# Altium footprint library myPcbLib.PcbLib: 987 footprints (part 57 of 62)
Each footprint in its own frame and in the unit in brackets; x right, y up, seen from the top. Pads: shape width x height; smd on the part's side, far side on the other; paste and mask are expansions set on the pad; w line width, h text height; cw(c..) or ccw(c..) is an arc to the next point about the centre after c.
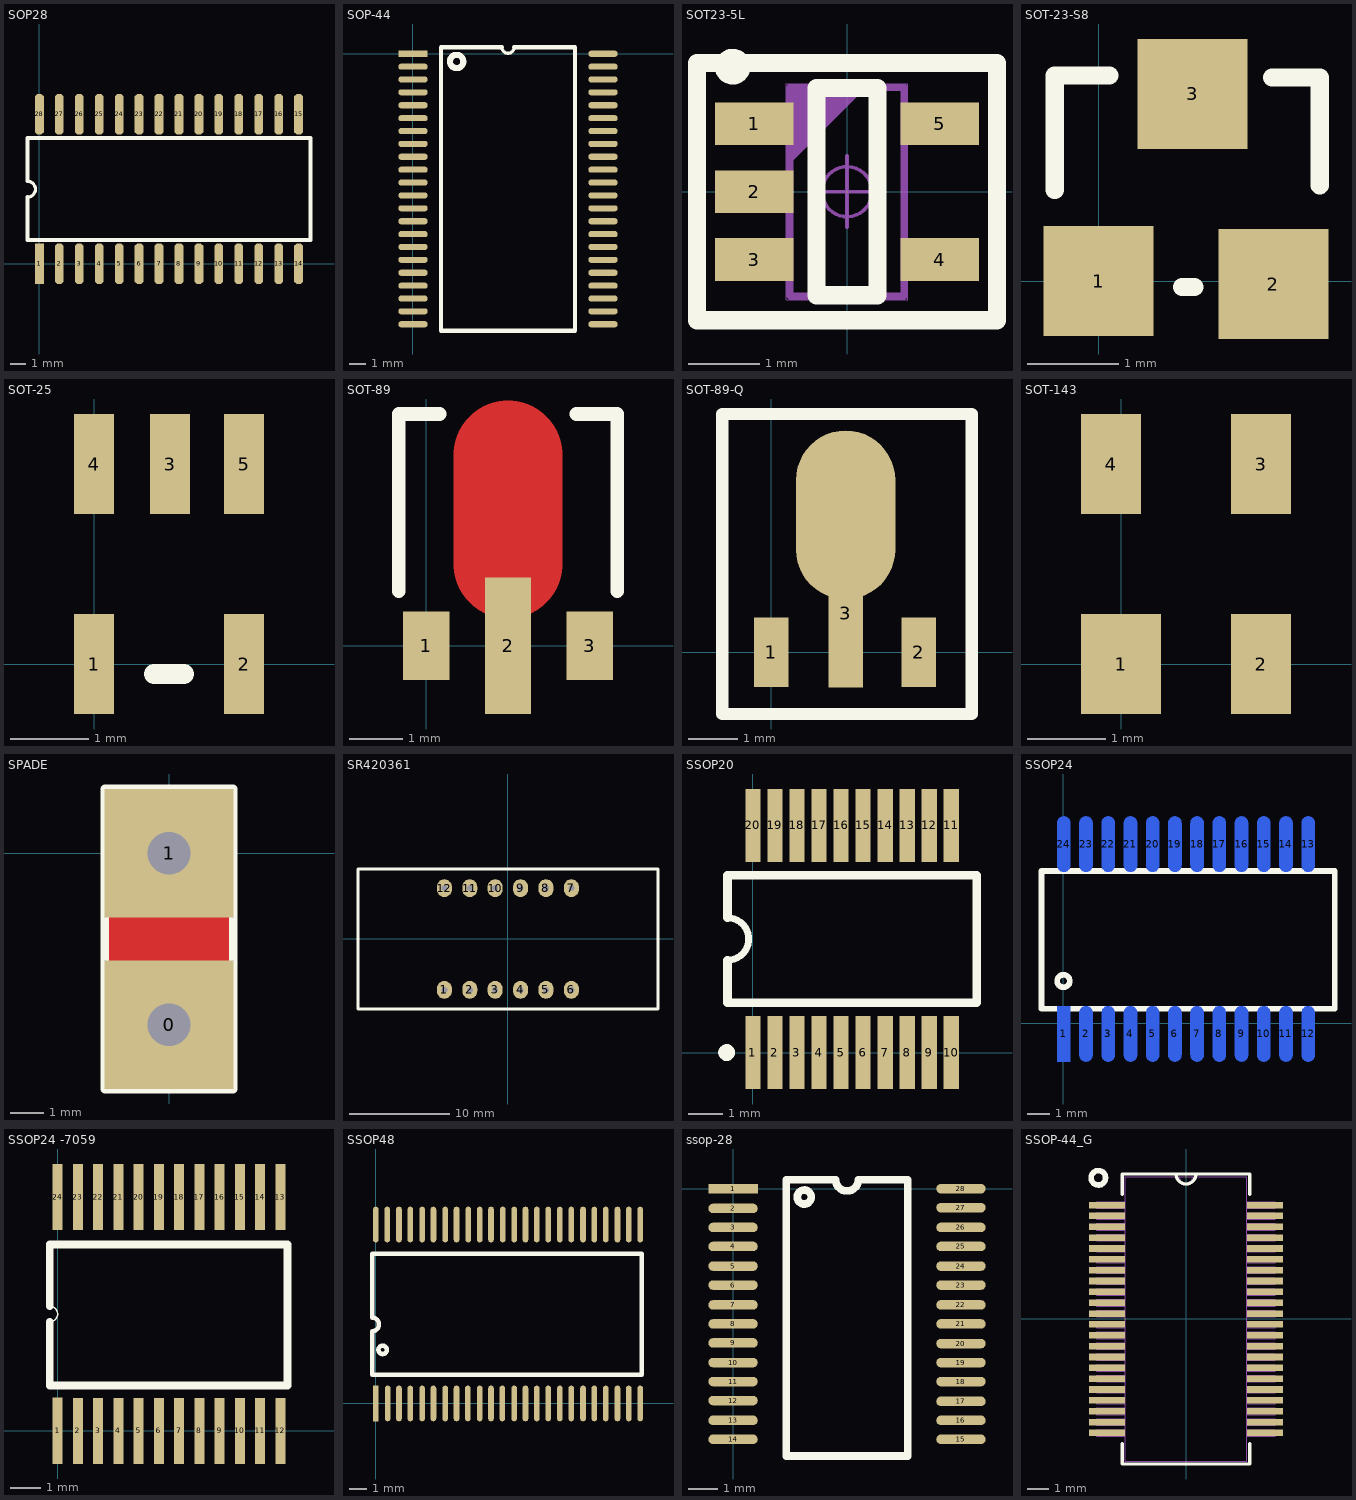
[diagram p56: the footprints below, top view; thin cyan lines are the x and y axes]

## SOP28 [mm]
height 3
pads (28):
  rect 0.559x2.6 smd: 1(0,0)
  oct 0.559x2.6 smd: 2(1.27,0) 3(2.54,0) 4(3.81,0) 5(5.08,0) 6(6.35,0) 7(7.62,0) 8(8.89,0) 9(10.16,0) 10(11.43,0) 11(12.7,0) 12(13.97,0) 13(15.24,0) 14(16.51,0) 15(16.51,9.525) 16(15.24,9.525) 17(13.97,9.525) 18(12.7,9.525) 19(11.43,9.525) 20(10.16,9.525) 21(8.89,9.525) 22(7.62,9.525) 23(6.35,9.525) 24(5.08,9.525) 25(3.81,9.525) 26(2.54,9.525) 27(1.27,9.525) 28(0,9.525)
Top Overlay:
  lines w0.203: -0.762,4.242 ccw(c-0.762,4.75) -0.762,5.258
  lines w0.254: -0.762,4.242 -0.762,1.524 17.272,1.524 17.272,8.001 -0.762,8.001 -0.762,5.258

## SOP-44 [mil]
pads (44):
  rect 72x15 smd: 1(0,0)
  oval 72x15 smd: 2(0,-31.5) 3(0,-62.99) 4(0,-94.49) 5(0,-125.98) 6(0,-157.48) 7(0,-188.98) 8(0,-220.47) 9(0,-251.97) 10(0,-283.46) 11(0,-314.96) 12(0,-346.46) 13(0,-377.95) 14(0,-409.45) 15(0,-440.94) 16(0,-472.44) 17(0,-503.94) 18(0,-535.43) 19(0,-566.93) 20(0,-598.43) 21(0,-629.92) 22(0,-661.42) 23(464.57,-661.42) 24(464.57,-629.92) 25(464.57,-598.43) 26(464.57,-566.93) 27(464.57,-535.43) 28(464.57,-503.94) 29(464.57,-472.44) 30(464.57,-440.94) 31(464.57,-409.45) 32(464.57,-377.95) 33(464.57,-346.46) 34(464.57,-314.96) 35(464.57,-283.46) 36(464.57,-251.97) 37(464.57,-220.47) 38(464.57,-188.98) 39(464.57,-157.48) 40(464.57,-125.98) 41(464.57,-94.49) 42(464.57,-62.99) 43(464.57,-31.5) 44(464.57,0)
Top Overlay:
  lines w7.87: 217.53,15.75 ccw(c232.28,15.75) 247.03,15.75
  lines w10: 217.53,15.75 68.31,15.75 68.31,-677.17 396.26,-677.17 396.26,15.75 247.03,15.75
  lines w15: 123,-19 cw(c106.69,-19) 122.99,-18.32

## SOT23-5L [mm]
pads (5):
  rect 1.1x0.6 smd: 1(-1.3,0.95) 2(-1.3,0) 3(-1.3,-0.95) 4(1.3,-0.95) 5(1.3,0.95)
Top Overlay:
  circle w0.25: c-1.6,1.75 r0.125
  lines w0.254: -2.1,-1.8 2.1,-1.8 2.1,1.8 -2.1,1.8 -2.1,-1.8 ; -0.425,-1.45 0.425,-1.45 0.425,1.45 -0.425,1.45 -0.425,-1.45
Mechanical 15:
  lines w0.1: -0.8,0.46 0.2,1.46 ; -0.8,0.56 0.1,1.46 ; -0.8,0.66 0,1.46 ; -0.8,0.76 -0.1,1.46 ; -0.8,0.86 -0.2,1.46 ; -0.8,0.96 -0.3,1.46 ; -0.8,1.06 -0.4,1.46 ; -0.8,1.16 -0.5,1.46 ; -0.8,1.26 -0.6,1.46 ; -0.8,1.36 -0.7,1.46 ; -0.8,-1.46 0.8,-1.46 0.8,1.46 -0.8,1.46 -0.8,-1.46
  text "1" at 0.45,-0.164 h0.75
Mechanical 16:
  circle w0.05: c0,0 r0.35
  lines w0.001: -0.85,-1.51 0.85,-1.51 0.85,1.51 -0.85,1.51 -0.85,-1.51
  lines w0.05: -0.5,0 0.5,0 ; 0,-0.5 0,0.5

## SOT-23-S8 [mm]
pads (3):
  rect 1.2x1.2 smd: 1(0,0) 2(1.909,-0.032) 3(1.027,2.043)
Top Overlay:
  lines w0.2: -0.476,0.995 -0.476,2.244 0.116,2.244 ; 0.91,-0.064 1.048,-0.064 ; 1.894,2.222 2.413,2.222 2.413,1.048

## SOT-25 [mil]
pads (5):
  rect 20x50 smd: 1(0,0) 2(75,0) 3(38,100) 4(0,100) 5(75,100)
Top Overlay:
  lines w10: 30,-5 45,-5

## SOT-89 [mil]
pads (3):
  rect 34x50 smd: 1(0,0) 3(120,0)
  rect 34x100 smd: 2(60,0)
Top Layer:
  lines w80: 60,60 60,140
Top Overlay:
  lines w10: -20,40 -20,170 10,170 ; 110,170 140,170 140,40

## SOT-89-Q [mm]
pads (4):
  rect 0.7x1.4 smd: 1(0,0) 2(2.974,0)
  rect 0.7x3 smd: 3(1.503,0.787)
  oval 2x3.4 smd: " "(1.5,2.768)
Top Overlay:
  lines w0.25: -0.99,4.773 -0.99,-1.244 4.043,-1.244 4.043,4.8 -0.99,4.8

## SOT-143 [mil]
pads (4):
  rect 40x50 smd: 1(0,0)
  rect 30x50 smd: 2(70,0) 3(70,100) 4(-5,100)

## SPADE [mm]
pads (2):
  rect 3.81x3.81 hole 1.27: 0(0,-5.08) 1(0,0)
Top Layer:
  rectangle: -1.905,-3.81 1.905,-1.27
Bottom Layer:
  rectangle: -1.905,-3.81 1.905,-1.27
Top Overlay:
  lines w0.254: -1.905,-6.985 1.905,-6.985 1.905,1.905 -1.905,1.905 -1.905,-6.985

## SR420361 [mm]
pads (12):
  oval 1.5x1.8 hole 0.6: 1(-6.35,-5.08) 2(-3.81,-5.08) 3(-1.27,-5.08) 4(1.27,-5.08) 5(3.81,-5.08) 6(6.35,-5.08) 7(6.35,5.08) 8(3.81,5.08) 9(1.27,5.08) 10(-1.27,5.08) 11(-3.81,5.08) 12(-6.35,5.08)
Top Overlay:
  lines w0.254: -14.986,-7 -14.986,7 15.014,7 15.014,-7 -14.986,-7

## SSOP20 [mm]
height 3
pads (20):
  rect 0.45x2.15 smd: 1(0,0) 2(0.65,0) 3(1.3,0) 4(1.95,0) 5(2.6,0) 6(3.25,0) 7(3.9,0) 8(4.55,0) 9(5.2,0) 10(5.85,0) 11(5.85,6.7) 12(5.2,6.7) 13(4.55,6.7) 14(3.9,6.7) 15(3.25,6.7) 16(2.6,6.7) 17(1.95,6.7) 18(1.3,6.7) 19(0.65,6.7) 20(0,6.7)
Top Overlay:
  circle w0.25: c-0.775,0 r0.125
  lines w0.2: -0.75,2.725 ccw(c-0.75,3.35) -0.75,3.975
  lines w0.254: -0.75,2.725 -0.75,1.475 6.6,1.475 6.6,5.225 -0.75,5.225 -0.75,3.975

## SSOP24 [mm]
pads (24):
  rect 0.6x2.5 smd far side: 1(0.021,-0.481)
  oval 0.6x2.5 smd far side: 2(1.021,-0.481) 3(2.021,-0.481) 4(3.021,-0.481) 5(4.021,-0.481) 6(5.021,-0.481) 7(6.021,-0.481) 8(7.021,-0.481) 9(8.021,-0.481) 10(9.021,-0.481) 11(10.021,-0.481) 12(11.021,-0.481) 13(11.021,8.058) 14(10.021,8.058) 15(9.021,8.058) 16(8.021,8.058) 17(7.021,8.058) 18(6.021,8.058) 19(5.021,8.058) 20(4.021,8.058) 21(3.021,8.058) 22(2.021,8.058) 23(1.021,8.058) 24(0.021,8.058)
Top Overlay:
  circle w0.254: c0.007,1.897 r0.284
  lines w0.254: -0.979,0.65 12.221,0.65 12.221,6.85 -0.979,6.85 -0.979,0.65

## SSOP24 -7059 [mil]
pads (24):
  rect 13x85 smd: 1(0,0) 2(26.02,-0.18) 3(52.02,-0.18) 4(78.02,-0.18) 5(104.02,-0.18) 6(130.02,-0.18) 7(156.02,-0.18) 8(182.02,-0.18) 9(208.02,-0.18) 10(234.02,-0.18) 11(260.02,-0.18) 12(286.02,-0.18) 13(286.02,299.82) 14(260.02,299.82) 15(234.02,299.82) 16(208.02,299.82) 17(182.02,299.82) 18(156.02,299.82) 19(130.02,299.82) 20(104.02,299.82) 21(78.02,299.82) 22(52.02,299.82) 23(26.02,299.82) 24(0.02,299.82)
Top Overlay:
  lines w2: -9.98,139.82 ccw(c-9.98,149.82) -9.98,159.82
  lines w10: -9.98,139.82 -9.98,58 295.02,58 295.02,239 -9.98,239 -9.98,159.82

## SSOP48 [mil]
pads (48):
  rect 12.5x78.74 smd: 1(0,0)
  oval 12.5x78.74 smd: 2(26,0) 3(51,0) 4(76,0) 5(102,0) 6(127,0) 7(153,0) 8(178,0) 9(203,0) 10(229,0) 11(254,0) 12(279,0) 13(305,0) 14(330,0) 15(355,0) 16(380,0) 17(406,0) 18(431,0) 19(457,0) 20(482,0) 21(507,0) 22(533,0) 23(558,0) 24(583,0) 25(583,394.76) 26(558,394.76) 27(533,394.76) 28(507,394.76) 29(482,394.76) 30(457,394.76) 31(431,394.76) 32(406,394.76) 33(380,394.76) 34(355,394.76) 35(330,394.76) 36(305,394.76) 37(280,394.76) 38(254,394.76) 39(229,394.76) 40(204,394.76) 41(178,394.76) 42(153,394.76) 43(127,394.76) 44(102,394.76) 45(76,394.76) 46(51,394.76) 47(25,394.76) 48(0,394.76)
Top Overlay:
  circle w10: c14.94,118.27 r9.22
  lines w10: -8.06,63 586.61,63 586.61,330.71 -8.06,330.71 -8.06,189.49 cw(c-8.06,174.49) -8.06,159.48 -8.06,63

## ssop-28 [mil]
pads (28):
  rect 65x12.5 smd: 1(0,0)
  oval 65x12.5 smd: 2(0,-26) 3(0,-51) 4(0,-76) 5(0,-102) 6(0,-127) 7(0,-153) 8(0,-178) 9(0,-203) 10(0,-229) 11(0,-254) 12(0,-279) 13(0,-305) 14(0,-330) 15(300,-330) 16(300,-305) 17(300,-280) 18(300,-254) 19(300,-229) 20(300,-204) 21(300,-178) 22(300,-153) 23(300,-127) 24(300,-102) 25(300,-76) 26(300,-51) 27(300,-25) 28(300,0)
Top Overlay:
  circle w10: c93.78,-11 r9.22
  lines w10: 70,-352 70,12 135,12 ccw(c150,12) 165,12 230,12 230,-352 70,-352

## SSOP-44_G [mil]
pads (44):
  rect 65x12 smd: 1(-143,206.64) 2(-143,186.96) 3(-143,167.28) 4(-143,147.6) 5(-143,127.92) 6(-143,108.24) 7(-143,88.56) 8(-143,68.88) 9(-143,49.2) 10(-143,29.52) 11(-143,9.84) 12(-143,-9.84) 13(-143,-29.52) 14(-143,-49.2) 15(-143,-68.88) 16(-143,-88.56) 17(-143,-108.24) 18(-143,-127.92) 19(-143,-147.6) 20(-143,-167.28) 21(-143,-186.96) 22(-143,-206.64) 23(143,-206.64) 24(143,-186.96) 25(143,-167.28) 26(143,-147.6) 27(143,-127.92) 28(143,-108.24) 29(143,-88.56) 30(143,-68.88) 31(143,-49.2) 32(143,-29.52) 33(143,-9.84) 34(143,9.84) 35(143,29.52) 36(143,49.2) 37(143,68.88) 38(143,88.56) 39(143,108.24) 40(143,127.92) 41(143,147.6) 42(143,167.28) 43(143,186.96) 44(143,206.64)
Top Overlay:
  circle w10: c-159,256 r13.04
  lines w6: -115.5,-225.74 -115.5,-263 115.5,-263 115.5,-225.74 ; -115.5,225.74 -115.5,263 115.5,263 115.5,225.74 ; -18.11,263 ccw(c0,263) 18.11,263
Mechanical 1:
  drawing of 181 lines, arcs and shapes, not listed